# Altium footprint library smdComponent.PcbLib: 182 footprints (part 2 of 12)
Each footprint in its own frame and in the unit in brackets; x right, y up, seen from the top. Pads: shape width x height; smd on the part's side, far side on the other; paste and mask are expansions set on the pad; w line width, h text height; cw(c..) or ccw(c..) is an arc to the next point about the centre after c.
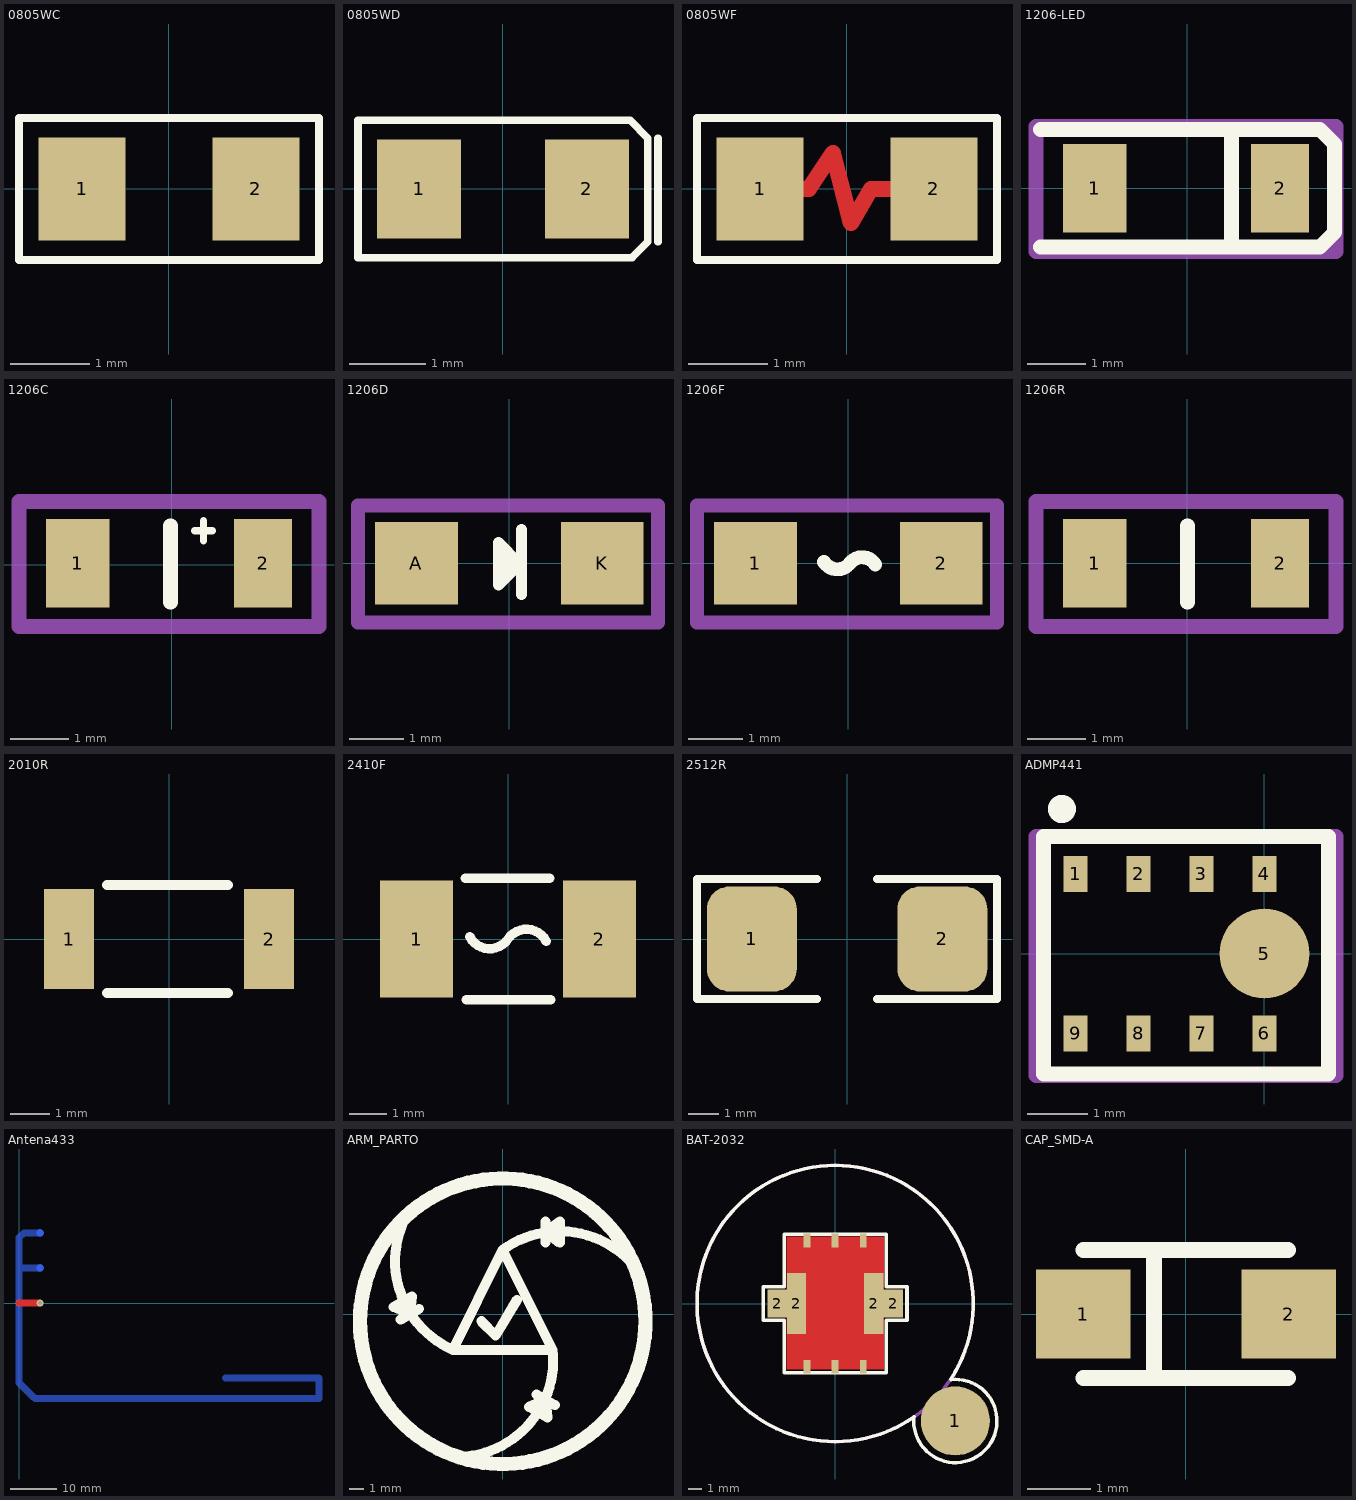
[diagram p1: the footprints below, top view; thin cyan lines are the x and y axes]

## 0805WC [mm]
pads (2):
  rect 1.1x1.3 smd: 1(-1.1,0) 2(1.1,0)
Top Overlay:
  lines w0.1: -1.9,-0.9 -1.9,0 -1.9,0.9 1.9,0.9 1.9,-0.9 -1.9,-0.9
3D body "0805 SMD Capacitor.STEP": height 0.78, standoff 0, extent -1.006,-0.625 0.994,0.625

## 0805WD [mm]
pads (2):
  rect 1.1x1.3 smd: 1(-1.1,0) 2(1.1,0)
Top Overlay:
  lines w0.1: 2.032,-0.691 2.032,0.665 ; -1.9,-0.9 -1.9,0 -1.9,0.9 1.665,0.9 1.9,0.665 1.9,-0.691 1.691,-0.9 -1.9,-0.9
3D body "User Library-LED0805.step": height 0.8, standoff 0, extent -1.084,-0.686 1.016,0.664

## 0805WF [mm]
pads (2):
  rect 1.1x1.3 smd: 1(-1.1,0) 2(1.1,0)
Top Layer:
  lines w0.203: -1.1,0 -0.483,0 -0.178,0.457 0.051,-0.432 0.305,0 1.1,0
Top Overlay:
  lines w0.1: -1.9,-0.9 1.9,-0.9 1.9,0.9 -1.9,0.9 -1.9,0 -1.9,-0.9

## 1206-LED [mil]
pads (2):
  rect 43.31x60 smd: 1(-63,0)
  rect 39.37x60 smd: 2(63,0)
Top Overlay:
  lines w10: -100,-40 90,-40 100,-30 100,30 90,40 -100,40 ; 20,40 30,40 30,-40
Mechanical 15:
  lines w10: -103,-43 101,-43 101,42 -103,42 -103,-43
3D body "1206-led.step": height 43.31, standoff 0, extent -62.99,-31.5 63,31.5

## 1206C [mil]
pads (2):
  rect 43.31x60 smd: 1(-64,1)
  rect 39.37x60 smd: 2(62,1)
Top Overlay:
  lines w5: 15.53,23.02 27.41,23.02 ; 21.43,16.13 21.43,29.91
  lines w10: -1,-25.58 -1,26.59
Mechanical 15:
  lines w10: -104,-42 -104,43 100,43 100,-42 -104,-42
3D body "1206C.step": height 67.32, standoff 0, extent -65.93,-32.07 67.93,34.08

## 1206D [mil]
pads (2):
  rect 60x60 smd: A(-67.5,0) K(67.5,0)
Top Overlay:
  lines w8: 7.07,-0.77 -7.93,-15.77 -7.93,15.02 7.07,0.02 ; 8.84,-22.62 8.84,24.62
  lines w12: -5.72,0.02 5.38,0.02
Mechanical 15:
  lines w10: -110,-43 108,-43 108,42 -110,42 -110,-43
3D body "1206D.step": height 56.54, standoff -0.54, extent -72.9,-28.47 64.9,28.47

## 1206F [mil]
pads (2):
  rect 60x60 smd: 1(-67.5,0) 2(67.5,0)
Top Overlay:
  lines w10: -17.63,0.95 ccw(c-8,7) 0.98,0.02 cw(c9.96,-6.97) 19.59,-0.92
Mechanical 15:
  lines w10: -110,-43 108,-43 108,42 -110,42 -110,-43
3D body "1206F.step": height 22.09, standoff -0.04, extent -64.03,-33 62.03,32.04

## 1206R [mil]
pads (2):
  rect 43.31x60 smd: 1(-63,0)
  rect 39.37x60 smd: 2(63,0)
Top Overlay:
  lines w10: 0,-26.57 0,25.59
Mechanical 15:
  lines w10: -103,-43 -103,42 101,42 101,-43 -103,-43
3D body "User Library-1206 SMD Resistor.step": height 39.45, standoff 0, extent -62.99,-31.49 63,31.51

## 2010R [mm]
pads (2):
  rect 1.27x2.54 smd: 1(-2.54,0) 2(2.54,0)
Top Overlay:
  lines w0.254: -1.575,-1.372 1.499,-1.372 ; -1.575,1.372 1.499,1.372
3D body "R2010-2.step": height 0.6, standoff 0, extent -2.551,-1.25 2.449,1.25

## 2410F [mm]
pads (2):
  rect 1.96x3.15 smd: 1(-2.45,0) 2(2.45,0)
Top Overlay:
  lines w0.254: -1.143,1.626 1.118,1.626 ; -1.118,-1.626 1.143,-1.626 ; -1.025,0.058 ccw(c-0.495,0.339) 0,0 cw(c0.495,-0.339) 1.025,-0.058

## 2512R [mm]
pads (2):
  rrect50% 3x3.5 smd: 1(-3.175,0) 2(3.175,0)
Top Overlay:
  lines w0.254: -1,-2 -5,-2 -5,2 -1,2 ; 1,-2 5,-2 5,2 1,2
3D body "User Library-2512 SMD Resistor.step": height 1.6, standoff 0, extent -3.175,-1.5 3.175,1.5

## ADMP441 [mm]
pads (9):
  rect 0.4x0.6 smd: 1(-3.15,1.33) 2(-2.1,1.33) 3(-1.05,1.33) 4(0,1.33) 6(0,-1.33) 7(-1.05,-1.33) 8(-2.1,-1.33) 9(-3.15,-1.33)
  round 1.5 smd mask+0: 5(0,0)
Top Overlay:
  circle w0.254: c-3.378,2.413 r0.108
  lines w0.254: -3.683,-2.007 1.067,-2.007 1.067,1.956 -3.683,1.956 -3.683,-2.007
Mechanical 3:
  lines w0.254: -3.81,-2.032 1.194,-2.032 1.194,1.956 -3.81,1.956 -3.81,-2.032
3D body "ADMP441.step": height 0.97, standoff -0.01, extent -3.655,-1.88 1.065,1.88

## Antena433 [mm]
pads (3):
  round 1.5 hole 0.7 unplated: 1(4.5,0)
  round 1.5 smd far side: 2(4.5,7.5) 2(4.5,15)
Top Layer:
  lines w1.5: 0,0 4.5,0
Bottom Layer:
  lines w1.5: 0.039,7.5 4.496,7.5 ; 4.496,15 1.039,15 0.039,14 0.039,-17 3.039,-20 3.435,-20.397 64.039,-20.397 64.039,-17 64.039,-16 44.039,-16

## ARM_PARTO [mm]
Top Overlay:
  circle w1: c0,-0.5 r10
  lines w0.7: -7.15,-0.375 -5.85,0.375 ; -6.951,6.477 ccw(c-0.737,3.714) -3.5,-2.5 ; -2.549,-9.977 ccw(c-3.263,-3.214) 3.5,-2.5 ; -1.5,-0.5 -0.5,-1.5 1,1 ; 2.35,-5.625 3.65,-6.375 ; 3,5 3,6.5 ; 9.5,3 ccw(c4,-1) 0,4.5 ; -3.5,-2.5 0,4.5 ; -3.5,-2.5 3.5,-2.5 ; 0,4.5 3.5,-2.5 ; -7.65,0.491 -6.5,0 -6.35,1.241 -7.65,0.491 ; 1.85,-6.491 3.15,-7.241 3,-6 1.85,-6.491 ; 3,5.75 4,5 4,6.5 3,5.75

## BAT-2032 [mm]
pads (11):
  round 5 smd: 1(8.701,-8.5)
  rect 1.4x2 smd: 2(-4.199,0) 2(4.201,0)
  rect 1.4x4.4 smd: 2(-2.799,0) 2(2.801,0)
  rect 0.5x1 smd: 2(-2.032,-4.572) 2(-2.032,4.572) 2(0,-4.572) 2(0,4.572) 2(2.032,-4.572) 2(2.032,4.572)
Top Layer:
  pour cut-out: -3.495,4.825 3.505,4.825 3.505,-4.775 -3.495,-4.775
Top Overlay:
  lines w0.254: 5.7,-8.21 ccw(c8.701,-8.5) 8.391,-5.501 ; 5.714,-8.206 cw(c0,0) 8.373,-5.467 ; -5.199,-1.2 -3.699,-1.2 -3.699,-5 3.701,-5 3.701,-1.2 5.201,-1.2 5.201,1.2 3.701,1.2 3.701,5 -3.699,5 -3.699,1.2 -5.199,1.2 -5.199,-1.2
Mechanical 15:
  circle w0.254: c0.001,0 r10

## CAP_SMD-A [mm] "1.6X3.25"
pads (2):
  rect 1.5x1.42 smd: 1(-1.63,0) 2(1.63,0)
Top Overlay:
  lines w0.254: -1.63,-1.016 1.62,-1.016 ; -1.63,1.016 1.62,1.016 ; -0.508,-1.016 -0.508,1.016
3D body "A Case SMT Capacitor.STEP": height 1.77, standoff 0.17, extent -1.637,-0.8 1.537,0.8